# Altium footprint library Mylib.PcbLib: 294 footprints (part 1 of 19)
Each footprint in its own frame and in the unit in brackets; x right, y up, seen from the top. Pads: shape width x height; smd on the part's side, far side on the other; paste and mask are expansions set on the pad; w line width, h text height; cw(c..) or ccw(c..) is an arc to the next point about the centre after c.
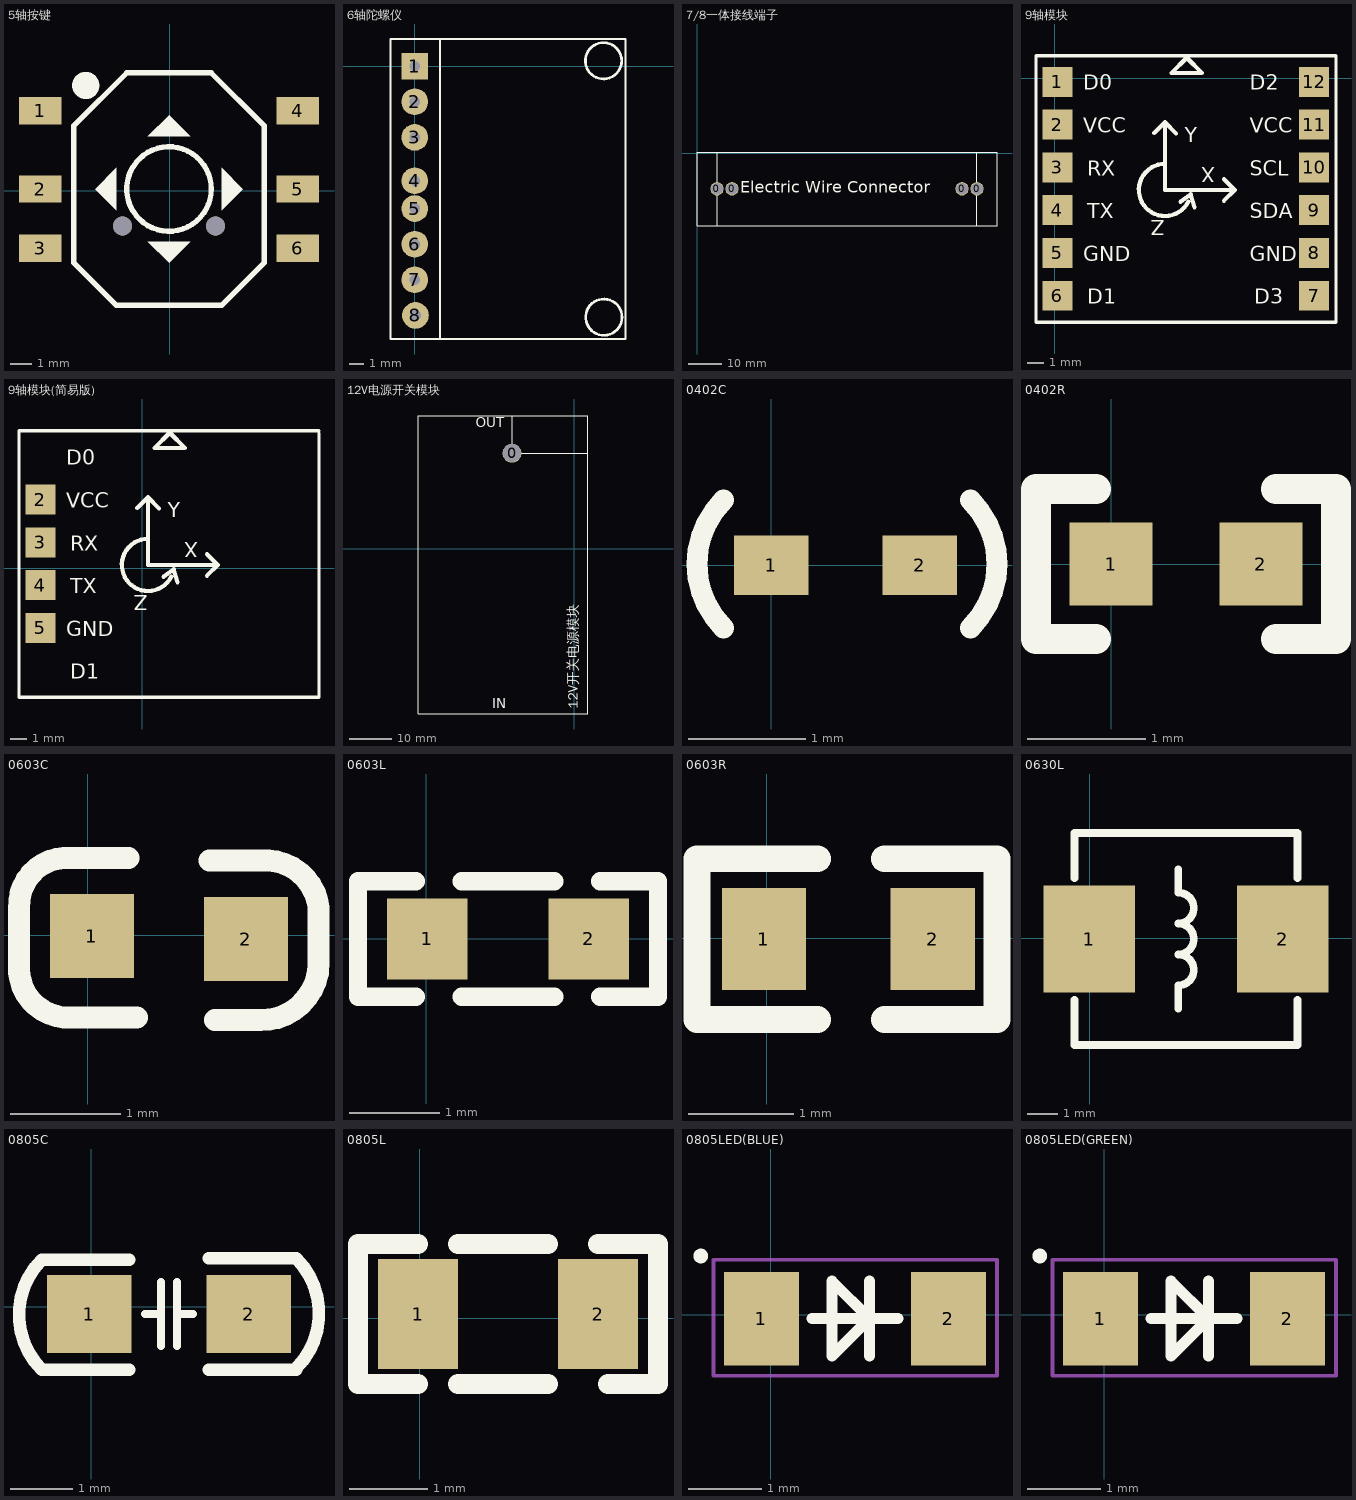
[diagram p0: the footprints below, top view; thin cyan lines are the x and y axes]

## 5轴按键 [mm]
pads (6):
  rect 2x1.3 smd: 1(-6.128,3.778) 2(-6.128,0.078) 3(-6.128,-2.722) 4(6.072,3.778) 5(6.072,0.078) 6(6.072,-2.722)
via -2.228,-1.672 diameter 0.9 hole 0.9
via 2.172,-1.672 diameter 0.9 hole 0.9
Top Overlay:
  circle w1: c-3.969,4.978 r0.141
  circle w0.254: c-0.028,0.078 r2
  region: 0.972,2.578 -0.028,3.578 -1.028,2.578
  region: 2.472,-0.922 3.472,0.078 2.472,1.078
  region: -1.028,-2.422 -0.028,-3.422 0.972,-2.422
  region: -2.528,1.078 -3.528,0.078 -2.528,-0.922
  lines w0.254: -4.528,-3.422 -2.528,-5.422 2.472,-5.422 4.472,-3.422 4.472,3.078 1.972,5.578 -2.028,5.578 -4.528,3.078 -4.528,-3.422

## 6轴陀螺仪 [mil]
pads (8):
  rect 75x75 hole 30: 1(0,0)
  round 75 hole 30: 2(0,-100) 3(0,-200) 4(0,-322) 5(0,-400) 6(0,-500) 7(0,-600) 8(2,-700)
Top Overlay:
  circle w7.8: c530.01,15 r50.99
  circle w7.8: c531,-705 r50.99
  lines w5: 71,-766.26 71,76.26 ; -67.9,-766.26 -67.9,76.26 591.55,76.26 591.55,-766.26 -67.9,-766.26
3D body "HDR1X8_2.54mm.STEP": height 398.11, standoff -56.22, extent -48,-749.99 52,50.01
3D body: height 307.09, standoff 279.53, extent -46,-752.5 600,84.5

## 7/8一体接线端子 [mm]
pads (4):
  round 4 hole 3.5: 0(6,-10.7) 0(10.5,-10.7) 0(79.5,-10.7) 0(84,-10.7)
Top Overlay:
  lines w0.254: 0,-21.7 77.9,-21.7 90,-21.7 90,0.3 0,0.3 0,-21.7 ; 6,-21.7 6,0.3 84,0.3 84,-21.8 83.9,-21.7 6,-21.7
  text "Electric Wire Connector" at 13,-13 h6

## 9轴模块 [mil]
pads (12):
  rect 70x70 smd: 1(5.91,-7.81) 2(5.91,-107.81) 3(5.91,-207.81) 4(5.91,-307.81) 5(5.91,-407.81) 6(5.91,-507.81) 7(605.91,-507.81) 8(605.91,-407.81) 9(605.91,-307.81) 10(605.91,-207.81) 11(605.91,-107.81) 12(605.91,-7.81)
Top Overlay:
  lines w7.87: -44.09,-457.81 -44.09,-57.81 ; 656.91,-457.81 656.91,-58.81
  lines w8: -44.09,-457.81 -44.09,-569.88 656.91,-569.88 656.91,-457.81 ; -44.09,-57.81 -44.09,53.19 656.91,53.19 656.91,-58.81
  lines w10: 232.21,-127.54 257.21,-102.54 257.21,-260.54 420.21,-260.54 ; 257.21,-199.51 ccw(c257.21,-260.54) 311.8,-287.84 ; 258.21,-103.54 283.21,-128.54 ; 293.34,-287.92 317.21,-270.54 326.15,-301.09 ; 395.21,-285.54 420.21,-260.54 ; 395.21,-235.54 420.21,-260.54 ; 272.64,12.8 343.5,12.8 308.07,48.23 272.64,12.8
  text "D3" at 465.91,-526.81 h35
  text "D2" at 455.91,-26.81 h35
  text "D1" at 75.91,-526.81 h35
  text "D0" at 65.91,-26.81 h35
  text "SCL" at 455.91,-226.81 h35
  text "SDA" at 455.91,-326.81 h35
  text "TX" at 75.91,-326.81 h35
  text "RX" at 75.91,-226.81 h35
  text "GND" at 455.91,-426.81 h35
  text "GND" at 65.91,-426.81 h35
  text "VCC" at 455.91,-126.81 h35
  text "VCC" at 65.91,-126.81 h35
  text "Z" at 256.89,-331.69 h35
  text "X" at 375.21,-207.54 h35
  text "Y" at 303.21,-148.54 h35
3D body "0402C.STEP": height 47.32, standoff 39.37, extent 487.13,17.72 526.5,41.35
3D body "0402C.STEP": height 47.32, standoff 39.37, extent 137.8,-198.5 177.17,-174.87
3D body "0402C.STEP": height 47.32, standoff 39.37, extent 372.05,-531.49 395.67,-492.12
3D body "0402C.STEP": height 47.32, standoff 39.37, extent 429.13,-531.5 452.76,-492.12
3D body "0402C.STEP": height 47.32, standoff 39.37, extent 145.67,-531.49 169.29,-492.12
3D body "0603 SMD Capacitor.STEP": height 51.26, standoff 39.37, extent 299.21,-535.44 330.71,-472.44
3D body "R0402.STEP": height 53.15, standoff 39.37, extent 482.28,-531.5 501.97,-492.13
3D body "0402C.STEP": height 47.32, standoff 39.37, extent 137.8,-257.87 177.17,-234.25
3D body "0402C.STEP": height 47.32, standoff 39.37, extent 86.61,-531.49 110.24,-492.12
3D body "led0805  green.step": height 82.68, standoff 38.87, extent 501.18,-434.33 551.18,-354.33
3D body: height 39.37, standoff 0, extent -9.84,-570.37 622.05,54.63
3D body "0603 SMD Capacitor.STEP": height 51.26, standoff 39.37, extent 220.47,-533.46 251.97,-470.46
3D body "QFN-36B6R00x6R00.step": height 74.8, standoff 39.37, extent 305.12,-249.01 545.28,-8.85
3D body "SOT23-5M.step": height 86.61, standoff 39.37, extent 318.91,-433.07 429.14,-314.95
3D body "QFN_18L 3.5 x 3.5.step": height 62.99, standoff 39.37, extent 115.16,-445.86 258.86,-302.16

## 9轴模块(简易版) [mil]
pads (4):
  rect 70x70 smd: 2(-238.19,159.91) 3(-238.19,59.91) 4(-238.19,-40.09) 5(-238.19,-140.09)
Top Overlay:
  lines w7.87: -288.19,-190.09 -288.19,209.91
  lines w8: -288.19,-190.09 -288.19,-302.17 412.81,-302.17 412.81,314.96 ; -288.19,209.91 -288.19,320.91 412.81,320.91
  lines w10: -11.89,140.17 13.11,165.17 13.11,7.17 176.11,7.17 ; 13.11,68.21 ccw(c13.11,7.17) 67.7,-20.12 ; 14.11,164.17 39.11,139.17 ; 49.24,-20.2 73.11,-2.83 82.05,-33.37 ; 151.11,-17.83 176.11,7.17 ; 151.11,32.17 176.11,7.17 ; 28.54,280.51 99.41,280.51 63.98,315.94 28.54,280.51
  text "D1" at -168.19,-259.09 h35
  text "D0" at -178.19,240.91 h35
  text "TX" at -168.19,-59.09 h35
  text "RX" at -168.19,40.91 h35
  text "GND" at -178.19,-159.09 h35
  text "VCC" at -178.19,140.91 h35
  text "Z" at 12.8,-63.98 h35
  text "X" at 131.11,60.17 h35
  text "Y" at 59.11,119.17 h35
3D body "0402C.STEP": height 47.32, standoff 39.37, extent 243.04,285.44 282.41,309.06
3D body "0402C.STEP": height 47.32, standoff 39.37, extent -106.29,69.22 -66.92,92.84
3D body "0402C.STEP": height 47.32, standoff 39.37, extent 127.95,-263.77 151.58,-224.4
3D body "0402C.STEP": height 47.32, standoff 39.37, extent 185.04,-263.78 208.66,-224.41
3D body "0402C.STEP": height 47.32, standoff 39.37, extent -98.42,-263.78 -74.8,-224.4
3D body "0603 SMD Capacitor.STEP": height 51.26, standoff 39.37, extent 55.12,-267.72 86.61,-204.72
3D body "R0402.STEP": height 53.15, standoff 39.37, extent 238.19,-263.78 257.88,-224.41
3D body "0402C.STEP": height 47.32, standoff 39.37, extent -106.29,9.85 -66.92,33.47
3D body "0402C.STEP": height 47.32, standoff 39.37, extent -157.48,-263.77 -133.86,-224.4
3D body "led0805  green.step": height 82.68, standoff 38.87, extent 257.09,-166.61 307.09,-86.61
3D body: height 39.37, standoff 0, extent -253.94,-302.65 377.96,322.35
3D body "0603 SMD Capacitor.STEP": height 51.26, standoff 39.37, extent -23.62,-265.74 7.87,-202.75
3D body "QFN-36B6R00x6R00.step": height 74.8, standoff 39.37, extent 61.03,18.71 301.19,258.87
3D body "SOT23-5M.step": height 86.61, standoff 39.37, extent 74.81,-165.35 185.04,-47.24
3D body "QFN_18L 3.5 x 3.5.step": height 62.99, standoff 39.37, extent -128.93,-178.14 14.77,-34.44

## 12V电源开关模块 [mm]
pads (1):
  round 4.5 hole 4.3: 0(-14.812,22.677)
Top Overlay:
  lines w0.254: -14.812,22.677 3.188,22.677 ; -14.812,22.777 -14.812,31.577 ; -37.112,-39.223 -37.112,31.577 3.188,31.577 3.188,-39.223 -37.112,-39.223
  text "12V开关电源模块" at 1.588,-38.023 h4
  text "OUT" at -23.412,27.977 h4
  text "IN" at -19.512,-38.723 h4

## 0402C [mil]
pads (2):
  rect 25x20 smd: 1(0,0) 2(50,0)
Top Overlay:
  lines w7: -16,-21 cw(c5.5,0.5) -16,22 ; 67,-21 ccw(c45.5,0.5) 67,22

## 0402R [mm]
pads (2):
  rect 0.7x0.7 smd: 1(0,0) 2(1.27,0)
Top Overlay:
  lines w0.254: -0.127,-0.635 -0.635,-0.635 -0.635,0.635 -0.127,0.635 ; 1.397,-0.635 1.905,-0.635 1.905,0.635 1.397,0.635
3D body "R0402.STEP": height 0.35, standoff 0, extent 0.211,-0.199 1.211,0.301

## 0603C [mil]
pads (2):
  rect 30x30 smd: 1(1.59,-0.39) 2(56.59,-1.39)
Top Overlay:
  lines w7.87: 14.59,27.61 -8.41,27.61 ccw(c-7.41,10.61) -24.41,9.61 -24.41,-10.39 ccw(c-6.91,-11.89) -8.41,-29.39 17.59,-29.39 ; 43.59,26.61 61.59,26.61 cw(c63.59,7.61) 82.59,9.61 82.59,-10.39 cw(c62.09,-9.89) 61.59,-30.39 45.59,-30.39
3D body "0603 SMD Capacitor.STEP": height 11.89, standoff 0, extent -0.11,-15.03 62.88,16.46

## 0603L [mil]
pads (2):
  rect 35x35 smd: 1(0.39,-0.2) 2(70.39,-0.2)
Top Overlay:
  lines w8: -4.61,-25.2 -29.61,-25.2 -29.61,24.8 -4.61,24.8 ; 15.39,-25.2 55.39,-25.2 ; 15.39,24.8 55.39,24.8 ; 75.39,-25.2 100.39,-25.2 100.39,24.8 75.39,24.8
3D body "0603L.STEP": height 31.5, standoff 0, extent 3.9,-16.69 66.89,14.8

## 0603R [mm]
pads (2):
  rect 0.8x0.965 smd: 1(-0.028,-0.005) 2(1.572,-0.005)
Top Overlay:
  lines w0.254: 0.48,-0.767 -0.663,-0.767 -0.663,0.757 0.48,0.757 ; 1.115,-0.767 2.182,-0.767 2.182,0.757 1.115,0.757
3D body "RES0603.STEP": height 0.45, standoff 0, extent -0.066,-0.415 1.534,0.405

## 0630L [mm]
pads (2):
  rect 3x3.5 smd: 1(-0.021,-0.021) 2(6.329,-0.021)
Top Overlay:
  lines w0.254: -0.504,-2.028 -0.504,-3.501 6.812,-3.501 6.812,-2.028 ; -0.504,1.986 -0.504,3.459 6.812,3.459 6.812,1.986 ; 2.9,-2.307 2.9,-1.545 ccw(c2.9,-1.037) 2.9,-0.529 ccw(c2.9,-0.021) 2.9,0.487 ccw(c2.9,0.995) 2.9,1.503 2.9,2.265
3D body "SMD0630L.STEP": height 3.05, standoff 0.02, extent -0.448,-3.067 6.502,3.533

## 0805C [mm]
pads (2):
  rect 1.35x1.25 smd: 1(-0.025,-0.112) 2(2.515,-0.112)
Top Overlay:
  lines w0.127: 0.864,-0.112 1.093,-0.112 ; 1.118,-0.62 1.118,0.396 ; 1.372,-0.62 1.372,0.396 ; 1.397,-0.112 1.626,-0.112
  lines w0.203: 0.61,-1.001 -0.787,-1.001 cw(c0.091,-0.123) -0.787,0.755 0.61,0.755 ; 1.88,-1.001 3.277,-1.001 ; 1.88,0.777 3.277,0.777 cw(c2.399,-0.102) 3.277,-0.98
3D body "0805(2012M).STEP": height 0.79, standoff 0, extent -0.025,-0.747 2.483,0.497

## 0805L [mil]
pads (2):
  rect 40x55 smd: 1(-0.83,2.24) 2(89.17,2.24)
Top Overlay:
  lines w10: -0.83,-32.76 -30.83,-32.76 -30.83,37.24 -0.83,37.24 ; 19.17,-32.76 64.17,-32.76 ; 19.17,37.24 64.17,37.24 ; 89.17,37.24 119.17,37.24 119.17,-32.76 94.17,-32.76
3D body "0805L.STEP": height 35.43, standoff 0, extent 9.17,-21.38 87.91,25.87

## 0805LED(BLUE) [mil]
pads (2):
  rect 40x50 smd: 1(-4.95,-2) 2(95.05,-2)
Top Overlay:
  circle w3.94: c-37.4,31.5 r1.97
  lines w5.91: 22.05,-2 68.05,-2 ; 52.92,-22 52.92,18 ; 32.92,-22 52.92,-2 32.92,18 32.92,-22
Mechanical 15:
  lines w1.97: -30.51,-32.48 111.77,-32.48 121.06,-32.48 121.06,29.53 -30.51,29.53 -30.51,-32.48
3D body: height 35.43, standoff 0, extent 10.83,-19.71 77.76,15.72

## 0805LED(GREEN) [mil]
pads (2):
  rect 40x50 smd: 1(-2,-2) 2(98,-2)
Top Overlay:
  circle w3.94: c-34.45,31.5 r1.97
  lines w5.91: 25,-2 71,-2 ; 55.87,-22 55.87,18 ; 35.87,-22 55.87,-2 35.87,18 35.87,-22
Mechanical 15:
  lines w1.97: -27.56,-32.48 114.72,-32.48 124.02,-32.48 124.02,29.53 -27.56,29.53 -27.56,-32.48
3D body "led0805  green.step": height 43.31, standoff -0.5, extent 7,-27 87,23